# Altium schematic symbol library LimeMicroAltiumLib_schLib_r05.SchLib: 582 symbols (part 12 of 13) (continued)
## TQL9092 (continued)
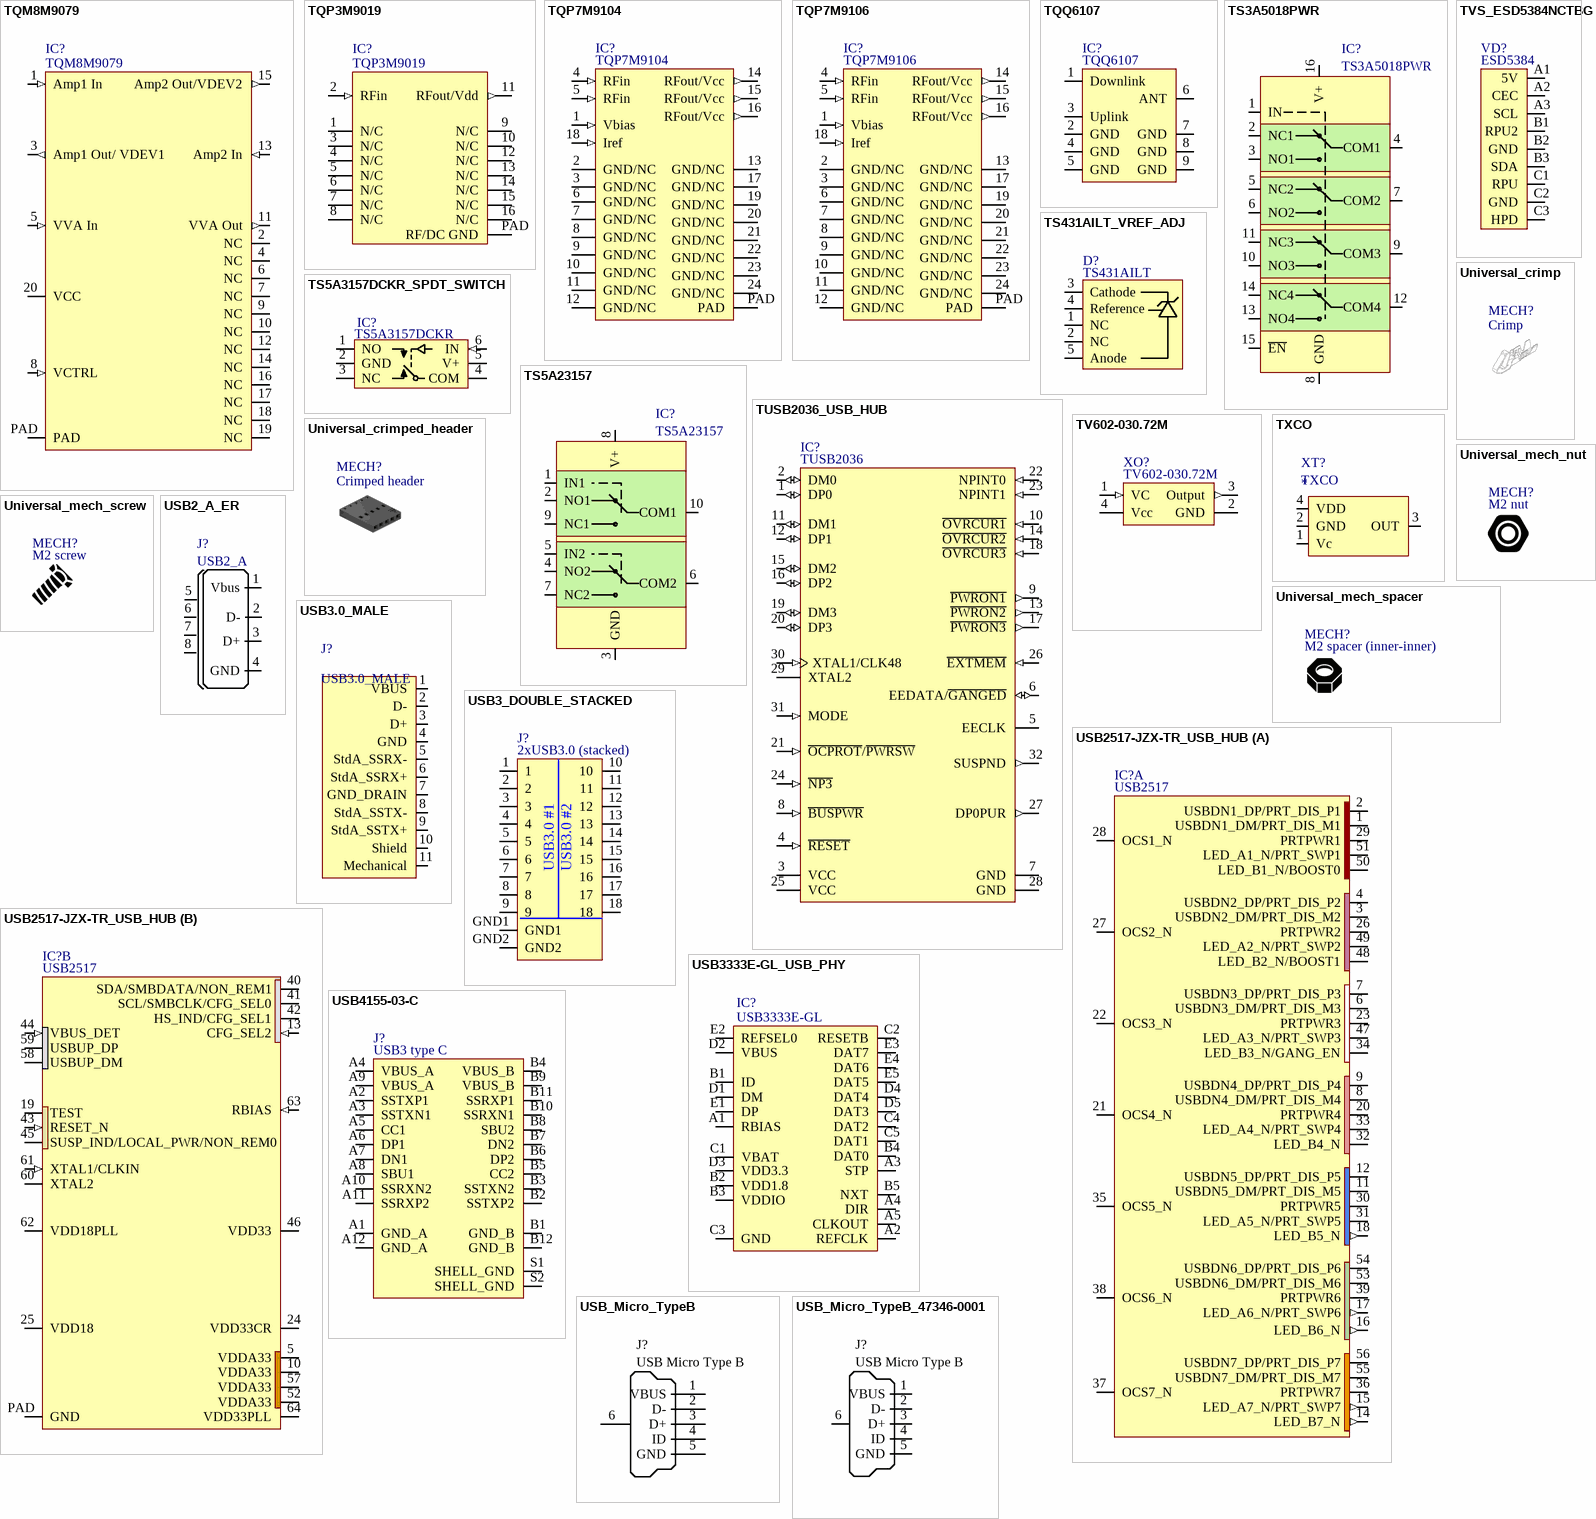
[diagram p66: symbols TQM8M9079 to USB_Micro_TypeB_47346-0001]

## TQM8M9079
designator IC?
Part Description: RF Amplifier 500-2700MHz NF 4dB Gain 38dB Attn. 30dB; Manufacturer: Qorvo; Manufacturer Part Number 1: TQM8M9079; Supplier Part Number 1: 772-TQM8M9079; Supplier 1: Mouser
footprint TQM8M9079
pins: 1 Amp1 In (in), 2 NC, 3 Amp1 Out/ VDEV1 (out), 4 NC, 5 VVA In (in), 6 NC, 7 NC, 8 VCTRL (in), 9 NC, 10 NC, 11 VVA Out (out), 12 NC, 13 Amp2 In (in), 14 NC, 15 Amp2 Out/VDEV2 (out), 16 NC, 17 NC, 18 NC, 19 NC, 20 VCC (power), PAD

## TQP3M9019
designator IC?
High Linearity LNA Gain Block (20 – 4000 MHz)
footprint TQP3M9019_QFN3X3-16 (Quad Flat No Lead, Plastic; 16 Terminals; Body 3 x 3 mm; Pitch 0.5 mm)
pins: 1 N/C, 2 RFin (in), 3 N/C, 4 N/C, 5 N/C, 6 N/C, 7 N/C, 8 N/C, 9 N/C, 10 N/C, 11 RFout/Vdd (out), 12 N/C, 13 N/C, 14 N/C, 15 N/C, 16 N/C, PAD RF/DC GND

## TQP7M9104
designator IC?
2 Watt High Linearity Amplifier (700 - 2700 MHz); Part Description: RF Amplifier 700-4000MHZ 5VOLT GAIN 15.8DB NF 4.4DB; Manufacturer: Qorvo; Manufacturer Part Number 1: TQP7M9104; Supplier Part Number 1: 772-TQP7M9104; Supplier 1: Mouser
footprint TQP7M9104_QFN24
pins: 1 Vbias (in), 2 GND/NC, 3 GND/NC, 4 RFin (in), 5 RFin (in), 6 GND/NC, 7 GND/NC, 8 GND/NC, 9 GND/NC, 10 GND/NC, 11 GND/NC, 12 GND/NC, 13 GND/NC, 14 RFout/Vcc (out), 15 RFout/Vcc (out), 16 RFout/Vcc (out), 17 GND/NC, 18 Iref (in), 19 GND/NC, 20 GND/NC, 21 GND/NC, 22 GND/NC, 23 GND/NC, 24 GND/NC, PAD

## TQP7M9106
designator IC?
2 Watt High Linearity Amplifier (50 - 1500 MHz); Part Description: RF Amplifier 50-1500MHz 2W Gain 20.8dB@940MHz; Manufacturer: Qorvo; Manufacturer Part Number 1: TQP7M9106; Supplier Part Number 1: 772-TQP7M9106; Supplier 1: Mouser
footprint TQP7M9106_QFN24 (Footprint not found)
pins: 1 Vbias (in), 2 GND/NC, 3 GND/NC, 4 RFin (in), 5 RFin (in), 6 GND/NC, 7 GND/NC, 8 GND/NC, 9 GND/NC, 10 GND/NC, 11 GND/NC, 12 GND/NC, 13 GND/NC, 14 RFout/Vcc (out), 15 RFout/Vcc (out), 16 RFout/Vcc (out), 17 GND/NC, 18 Iref (in), 19 GND/NC, 20 GND/NC, 21 GND/NC, 22 GND/NC, 23 GND/NC, 24 GND/NC, PAD

## TQQ6107
designator IC?
Part Description: Band 7 BAW Duplexer, 70 MHz Bandwidth, 2.00 x 2.50 x 1.0 mm; Manufacturer Part Number 1: TQQ6107; Supplier Part Number 1: TQQ6107; Supplier 1: Qorvo
footprint TQQ6107
pins: 1 Downlink, 2 GND, 3 Uplink, 4 GND, 5 GND, 6 ANT (io), 7 GND, 8 GND, 9 GND

## TS3A5018PWR
designator IC?
Manufacturer: TEXAS INSTRUMENTS; On State Resistance Max: 10; Analog Switch Case: TSSOP; Supply Voltage Range: 2.3V to 3.6; No. of Pins: 16; Analog Switch Type: SPDT; Supplier 1: Newark; Manufacturer Part Number: TS3A5018PW; Supplier Part Number 1: 71J8329
footprint TS3A5018PWR (TSOP, 16-Leads, Body 5,00x4,40mm, Pitch 0,65mm, IPC Medium Density)
pins: 1 IN, 2 NC1, 3 NO1, 4 COM1, 5 NC2, 6 NO2, 7 COM2, 8 GND, 9 COM3, 10 NO3, 11 NC3, 12 COM4, 13 NO4, 14 NC4, 15 ~{EN}, 16 V+

## TS5A3157DCKR_SPDT_SWITCH
designator IC?, comment TS5A3157DCKR
Manufacturer: Texas Instruments; Part Description: 1 Circuit IC Switch 2:1 10Ohm SC-70-6; Nominal Supply Current: 2.5uA; Max Supply Voltage: 5.5V; Min Supply Voltage: 1.65V; Number of Channels: 1; Number of Outputs: 2; On-State Resistance: 10R; Turn-On Delay Time: 9.5ns; Turn-Off Delay Time: 7.5ns; Max Supply Current: 5uA; Throw Configuration: SPDT; Supply Type: Single; Bandwidth: 300MHz; Polarity: Non-Inverting; High Level Output Current: 100mA; Supplier 1: Digi-Key; Manufacturer Part Number 1: TS5A3157DCKR; Stock 1: 48414; Pricing 1: 1 = 0,42000, 10 = 0,35900, 100 = 0,26820, 500 = 0,21074, 1000 = 0,16284 (USD); RoHS: Yes; Mount: Surface Mount; Case/Package: SC; Number of Pins: 6; Weight: 8.8E-05oz; Contact Plating: Gold; Min Operating Temperature: -40°C; Max Operating Temperature: 85°C; Number of Inputs: 1; Packaging: Tape and Reel; Package Quantity: 1; Operating Supply Current: 2.5uA; Number of Bits: 1; Low Level Output Current: 100mA; Length: 2mm; Height: 0.9mm; Width: 1.25mm; Radiation Hardening: No; REACH SVHC: No SVHC; Lead Free: Lead Free; ComponentLink1URL: https://datasheet.ciiva.com/2980/ts5a3157-2980096.pdf?src-supplier=Avnet; ComponentLink1Description: https://datasheet.ciiva.com/2980/ts5a3157-2980096.pdf?src-supplier=Avnet; ComponentLink2URL: https://datasheet.ciiva.com/15127/getdatasheetpartid-250849-15127576.pdf?src-supplier=Verical; ComponentLink2Description: https://datasheet.ciiva.com/15127/getdatasheetpartid-250849-15127576.pdf?src-supplier=Verical; ComponentLink3URL: https://datasheet.ciiva.com/30509/ts5a3157dckr-30509768.pdf?src-supplier=RSComponents; ComponentLink3Description: https://datasheet.ciiva.com/30509/ts5a3157dckr-30509768.pdf?src-supplier=RSComponents; ComponentLink4URL: https://datasheet.ciiva.com/22652/1716489-22652683.pdf?src-supplier=Element14; ComponentLink4Description: https://datasheet.ciiva.com/22652/1716489-22652683.pdf?src-supplier=Element14; ComponentLink5URL: https://datasheet.ciiva.com/26266/ts5a3157-26266631.pdf?src-supplier=Avnet+Europe; ComponentLink5Description: https://datasheet.ciiva.com/26266/ts5a3157-26266631.pdf?src-supplier=Avnet+Europe; ComponentLink6URL: https://datasheet.ciiva.com/46382/1877040-46382312.pdf?src-supplier=Element14; ComponentLink6Description: https://datasheet.ciiva.com/46382/1877040-46382312.pdf?src-supplier=Element14; ComponentLink7URL: https://datasheet.ciiva.com/1680/ts5a3157-1680281.pdf?src-supplier=Digi-Key; ComponentLink7Description: https://datasheet.ciiva.com/1680/ts5a3157-1680281.pdf?src-supplier=Digi-Key; ComponentLink8URL: https://datasheet.ciiva.com/2978/ts5a3157-2978985.pdf?src-supplier=Avnet; ComponentLink8Description: https://datasheet.ciiva.com/2978/ts5a3157-2978985.pdf?src-supplier=Avnet; ComponentLink9URL: https://datasheet.ciiva.com/1680/ts5a3157-1680250.pdf?src-supplier=Digi-Key; ComponentLink9Description: https://datasheet.ciiva.com/1680/ts5a3157-1680250.pdf?src-supplier=Digi-Key; ComponentLink10URL: https://datasheet.ciiva.com/1680/ts5a3157-1680282.pdf?src-supplier=Digi-Key; ComponentLink10Description: https://datasheet.ciiva.com/1680/ts5a3157-1680282.pdf?src-supplier=Digi-Key; ComponentLink11URL: https://datasheet.ciiva.com/28500/ts5a3157-28500239.pdf?src-supplier=Element14; ComponentLink11Description: https://datasheet.ciiva.com/28500/ts5a3157-28500239.pdf?src-supplier=Element14; ComponentLink12URL: https://datasheet.ciiva.com/41461/001187245-da-01-en-ic-switch-spdt-ts5a3157dckr-sc-70-6-tid-41461835.pdf?src-supplier=Conrad; ComponentLink12Description: https://datasheet.ciiva.com/41461/001187245-da-01-en-ic-switch-spdt-ts5a3157dckr-sc-70-6-tid-41461835.pdf?src-supplier=Conrad; Supplier Part Number 1: 296-17588-1-ND
footprint SC-70-6_TS5A3157DCKR (SC-70 (SOT323), 6 pin)
pins: 1 NO (io), 2 GND, 3 NC (io), 4 COM (io), 5 V+ (power), 6 IN (in)

## TS5A23157
designator IC?
TS3A5018; Manufacturer: Texas Instruments; Current - Supply: 1µA; Circuit: 2 x SPDT; On-State Resistance: 10 Ohm; Voltage Supply Source: Single Supply; Voltage - Supply, Single/Dual (±): 1.8 V ~ 5.5 V; Function: Switch; Supplier 1: Digi-Key; Category: Integrated Circuits (ICs); Supplier Device Package: 10-VSSOP; Package / Case: 10-TFSOP, 10-MSOP (0.118", 3.00mm Width); Mounting Type: Surface Mount; Supplier Part Number 1: 296-17076-1-ND
footprint TS5A23157 (TSSOP, 10-Leads, Body 3,00x3,00mm, Pitch 0,50mm, IPC Medium Density)
pins: 1 IN1, 2 NO1, 3 GND, 4 NO2, 5 IN2, 6 COM2, 7 NC2, 8 V+, 9 NC1, 10 COM1

## TS431AILT_VREF_ADJ
designator D?, comment TS431AILT
Manufacturer: STMicroelectronics; Part Description: Shunt Voltage Reference IC 6V ±1% 30mA SOT-23-5; Nominal Supply Current: 30mA; Output Voltage: 6V; Max Input Voltage: 10V; Number of Channels: 1; Tolerance: 1%; Temperature Coefficient: 100ppm/°C; Cathode Current: 60uA; Reference Voltage: 1.24V; Min Output Voltage: 1.228V; Reference Type: Adjustable,Shunt; Supplier 1: Digi-Key; Manufacturer Part Number 1: TS431AILT; Stock 1: 5120; Pricing 1: 1=0.62, 10=0.533, 100=0.398, 500=0.3127, 1000=0.24164 (USD); Mount: Surface Mount; Case/Package: SOT-23-5; Number of Pins: 5; Min Operating Temperature: -40°C; Max Operating Temperature: 125°C; Packaging: Tape and Reel; Max Output Current: 30mA; Package Quantity: 1; Output Current: 30mA; Max Output Voltage: 6V; Termination: SMD/SMT; Length: 3mm; Height: 1.3mm; Width: 1.75mm; Radiation Hardening: No; REACH SVHC: No SVHC; Lead Free: Lead Free; ComponentLink1URL: https://www.verical.com/server-webapp/html/getDatasheet?partID=139054; ComponentLink1Description: https://www.verical.com/server-webapp/html/getDatasheet?partID=139054; ComponentLink2URL: http://www.st.com/content/ccc/resource/technical/document/datasheet/group1/3f/2e/70/d8/11/ee/47/a9/CD00001336/files/CD00001336.pdf/jcr:content/translations/en.CD00001336.pdf; ComponentLink2Description: http://www.st.com/content/ccc/resource/technical/document/datasheet/group1/3f/2e/70/d8/11/ee/47/a9/CD00001336/files/CD00001336.pdf/jcr:content/translations/en.CD00001336.pdf; ComponentLink3URL: http://www.st.com/web/en/resource/technical/document/datasheet/CD00001336.pdf; ComponentLink3Description: http://www.st.com/web/en/resource/technical/document/datasheet/CD00001336.pdf; ComponentLink4URL: http://www.farnell.com/datasheets/1700526.pdf; ComponentLink4Description: http://www.farnell.com/datasheets/1700526.pdf; ComponentLink5URL: http://www.mouser.com/ds/2/389/ts431-957324.pdf; ComponentLink5Description: http://www.mouser.com/ds/2/389/ts431-957324.pdf; ComponentLink6URL: http://www.produktinfo.conrad.com/datenblaetter/1100000-1199999/001185084-da-01-en-IC_VREF_SHUNT_PRE_TS431AILT_SOT_23_5_STM.pdf; ComponentLink6Description: http://www.produktinfo.conrad.com/datenblaetter/1100000-1199999/001185084-da-01-en-IC_VREF_SHUNT_PRE_TS431AILT_SOT_23_5_STM.pdf; ComponentLink7URL: http://datasheet.iiic.cc/stmicroelectronics/TS431AILT.pdf; ComponentLink7Description: http://datasheet.iiic.cc/stmicroelectronics/TS431AILT.pdf; Supplier Part Number 1: 497-2279-6-ND
footprint SOT23-5
pins: 1 NC, 2 NC, 3 Cathode, 4 Reference, 5 Anode

## TUSB2036_USB_HUB
designator IC?, comment TUSB2036
Part Description: USB Hub Controller USB 2.0 USB Interface 32-LQFP (7x7); Manufacturer: Texas Instruments; Manufacturer Part Number 1: TUSB2036VF; Operating Supply Voltage: 3.3V; Operating Supply Current: 40mA; Data Rate: 12Mbps; Min Supply Voltage: 3V; Max Supply Voltage: 3.6V; Number of Ports: 3; USB Standard: USB 2.0; ComponentLink1URL: https://datasheet.ciiva.com/1505/1535702-1505189.pdf?src-supplier=Element14; ComponentLink1Description: https://datasheet.ciiva.com/1505/1535702-1505189.pdf?src-supplier=Element14; ComponentLink2URL: https://datasheet.ciiva.com/1613/tusb2036-1613315.pdf?src-supplier=Newark; ComponentLink2Description: https://datasheet.ciiva.com/1613/tusb2036-1613315.pdf?src-supplier=Newark; ComponentLink3URL: https://datasheet.ciiva.com/15134/getdatasheetpartid-225880-15134503.pdf?src-supplier=Verical; ComponentLink3Description: https://datasheet.ciiva.com/15134/getdatasheetpartid-225880-15134503.pdf?src-supplier=Verical; ComponentLink4URL: https://datasheet.ciiva.com/5835/1535702-5835498.pdf?src-supplier=Farnell; ComponentLink4Description: https://datasheet.ciiva.com/5835/1535702-5835498.pdf?src-supplier=Farnell; ComponentLink5URL: https://datasheet.ciiva.com/1695/tusb2036-1695700.pdf?src-supplier=Digi-Key; ComponentLink5Description: https://datasheet.ciiva.com/1695/tusb2036-1695700.pdf?src-supplier=Digi-Key; ComponentLink6URL: https://datasheet.ciiva.com/41461/001187495-da-01-en-ic-2-3-port-usb-h-tusb2036vf-lqfp-32-tid-41461301.pdf?src-supplier=Conrad; ComponentLink6Description: https://datasheet.ciiva.com/41461/001187495-da-01-en-ic-2-3-port-usb-h-tusb2036vf-lqfp-32-tid-41461301.pdf?src-supplier=Conrad; Supplier 1: Digi-Key; Supplier Part Number 1: 296-11086-ND; Stock 1: 77; Pricing 1: 1=4,18000, 10=3,75400, 25=3,54880, 80=3,07575, 250=2,91796, 500=2,61828, 1000=2,38080 (USD); RoHS: Yes; Case/Package: LQFP; Number of Pins: 32; Weight: 0.006148oz; Min Operating Temperature: 0°C; Max Operating Temperature: 70°C; Package Quantity: 250; Packaging: Tray; Termination: SMD/SMT; Length: 7mm; Width: 7mm; Height: 1.4mm; Radiation Hardening: No; Lead Free: Lead Free; RoHS Compliant: Yes; REACH SVHC: No SVHC
footprint TUSB2036_USB_HUB_32-LQFP (Footprint not found)
pins: 1 DP0 (io) "Root port USB differential data plus. DP0 paired with DM0 constitutes the upstream USB port.", 2 DM0 (io) "Root port USB differential data minus. DM0 paired with DP0 constitutes the upstream USB port.", 3 VCC (power) "3.3-V supply voltage", 4 ~{RESET} (in) "R\E\S\E\T\ is an active low TTL input with hysteresis and must be asserted at power up. When R\E\S\E\T\ is asserted, all logic is initialized. Generally, a reset with a pulse width between 100 us and 1 ms is recommended (See Datasheet)", 5 EECLK (hiz) "EEPROM serial clock. When EXTMEM is high, the EEPROM interface is disabled. The EECLK terminal is disabled and must be left floating (unconnected). When EXTMEM is low, EECLK acts as a 3-state serial clock output to the (See Datasheet)", 6 EEDATA/~{GANGED} (io) "EEPROM serial data/power-management mode indicator. When E\X\T\M\E\M\ is high, EEDATA/G\A\N\G\E\D\ selects between ganged or per-port power overcurrent detection for the downstream ports. When E\X\T\M\E\M\ is (See Datasheet)", 7 GND (power) "GND terminals must be tied to ground for proper operation", 8 ~{BUSPWR} (in) "Power source indicator. B\U\S\P\W\R\ is an active-low input that indicates whether the downstream ports source their power from the USB cable or a local power supply. For the bus-power mode, this terminal must be pulled low, (See Datasheet)", 9 ~{PWRON1} (out) "Power-on/-off control signals. P\W\R\O\N\1\-P\W\R\O\N\3\ are active low, push-pull outputs that enables the external power switch device. Push-pull outputs eliminate the pullup resistors which open-drain outputs require. (See Datasheet)", 10 ~{OVRCUR1} (in) "Overcurrent input. O\V\R\C\U\R\1\ - O\V\R\C\U\R\3\ are active low. For per-port overcurrent detection, one overcurrent input is available for each of the three downstream ports. In the ganged mode, any O\V\R\C\U\R\ input may (See Datasheet)", 11 DM1 (io) "USB differential data minus. DM1-DM3 paired with DP1-DP3 support up to four downstream USB ports.", 12 DP1 (io) "USB differential data plus. DP1-DP3 paired with DM1-DM3 support up to four downstream USB ports.", 13 ~{PWRON2} (out) "Power-on/-off control signals. P\W\R\O\N\1\-P\W\R\O\N\3\ are active low, push-pull outputs that enables the external power switch device. Push-pull outputs eliminate the pullup resistors which open-drain outputs require. (See Datasheet)", 14 ~{OVRCUR2} (in) "Overcurrent input. O\V\R\C\U\R\1\ - O\V\R\C\U\R\3\ are active low. For per-port overcurrent detection, one overcurrent input is available for each of the three downstream ports. In the ganged mode, any O\V\R\C\U\R\ input may (See Datasheet)", 15 DM2 (io) "USB differential data minus. DM1-DM3 paired with DP1-DP3 support up to four downstream USB ports.", 16 DP2 (io) "USB differential data plus. DP1-DP3 paired with DM1-DM3 support up to four downstream USB ports.", 17 ~{PWRON3} (out) "Power-on/-off control signals. P\W\R\O\N\1\-P\W\R\O\N\3\ are active low, push-pull outputs that enables the external power switch device. Push-pull outputs eliminate the pullup resistors which open-drain outputs require. (See Datasheet)", 18 ~{OVRCUR3} (in) "Overcurrent input. O\V\R\C\U\R\1\ - O\V\R\C\U\R\3\ are active low. For per-port overcurrent detection, one overcurrent input is available for each of the three downstream ports. In the ganged mode, any O\V\R\C\U\R\ input may (See Datasheet)", 19 DM3 (io) "USB differential data minus. DM1-DM3 paired with DP1-DP3 support up to four downstream USB ports.", 20 DP3 (io) "USB differential data plus. DP1-DP3 paired with DM1-DM3 support up to four downstream USB ports.", 21 ~{OCPROT}/~{PWRSW} (in) "Overcurrent Protection for bus-powered hub (active low). /Power Switching for self-powered hub (active low). The terminal has a different meaning for the bus or self-powered hub. If the terminal is logic high the internal (See Datasheet)", 22 NPINT0 (in) "Number of ports internal to hub system, which are permanently attached (see Table 1).", 23 NPINT1 (in) "Number of ports internal to hub system, which are permanently attached (see Table 1).", 24 ~{NP3} (in) "Number of ports is 3. Active low input. A logic 0 configures the system to use 3 ports. A logic 1 configures the system to use 2 ports.", 25 VCC (power) "3.3-V supply voltage", 26 ~{EXTMEM} (in) "When E\X\T\M\E\M\ is high, the serial EEPROM interface of the device is disabled. When E\X\T\M\E\M\ is low, terminals 5 and 6 are configured as the clock and data terminals of the serial EEPROM interface, respectively.", 27 DP0PUR (out) "Pullup resistor connection. When a system reset happens (R\E\S\E\T\ being driven to low, but not USB reset) or any logic level change on B\U\S\P\W\R\ terminal, DP0PUR output is inactive (floating) until the internal counter (See Datasheet)", 28 GND (power) "GND terminals must be tied to ground for proper operation.", 29 XTAL2 "Crystal 2. XTAL2 is a 6-MHz crystal output. This terminal must be left open when using an oscillator", 30 XTAL1/CLK48 (in) "Crystal 1/48-MHz clock input. When MODE is low, XTAL1/CLK48 is a 6-MHz crystal input with 50% duty cycle. An internal APLL generates the 48-MHz and 12-MHz clocks used internally by the ASIC logic. When MODE is (See Datasheet)", 31 MODE (in) "Mode select. When MODE is low, the APLL output clock is selected as the clock source to drive the internal core of the device and 6-MHz crystal or oscillator can be used. When MODE is high, the clock on XTAL1/CLK48 is (See Datasheet)", 32 SUSPND (out) "Suspend status. SUSPND is an active high output available for external logic power-down operations. During the suspend mode, SUSPND is high. SUSPND is low for normal operation."

## TV602-030.72M
designator XO?
Part Description: TV602-030.72M voltage controlled oscillator, 5x7mm, high stability and low phase noise; Manufacturer: Connor Winfield; Supplier Part Number 1: TV602-030.72M; Manufacturer Part Number 1: TV602-030.72M; Supplier 1: Connor Winfield
footprint TV602-030.72M (TV602-030.72M Connor Winfield)
pins: 1 VC (in), 2 GND, 3 Output (out), 4 Vcc (power)

## TVS_ESD5384NCTBG
designator VD?, comment ESD5384
Manufacturer: ON Semiconductor; Manufacturer Part Number 1: ESD5384NCTBG; Part Description: TVS DIODE 3V 9WLCSP; Capacitance: 29pF; Direction: Unidirectional; Number of Unidirectional Channels: 5; Reverse Standoff Voltage: 3V; Min Breakdown Voltage: 6V; Power Line Protection: No; ESD Protection: Yes; Max Reverse Leakage Current: 200nA; Supplier 1: Digi-Key; Stock 1: 4993; Pricing 1: 1=0.47, 10=0.406, 100=0.3028, 500=0.23794, 1000=0.18386 (USD); Number of Pins: 9; Min Operating Temperature: -30°C; Max Operating Temperature: 85°C; Package Quantity: 5000; Packaging: Tape and Reel; Number of Lines: 5; Composition: Zener; Length: 1.14mm; Height: 0.63mm; Width: 1.14mm; Depth: 1.14mm; Radiation Hardening: No; Lead Free: Lead Free; Halogen Free: Halogen Free; Supplier Part Number 1: ESD5384NCTBGOSDKR-ND
footprint TVS_ ESD5384NCTBG
pins: A1 5V, A2 CEC, A3 SCL, B1 RPU2, B2 GND, B3 SDA, C1 RPU, C2 GND, C3 HPD

## TXCO
designator XT?
Assembly Info: *
pins: 1 Vc, 2 GND, 3 OUT, 4 VDD

## Universal_crimp
designator MECH?, comment Crimp  (mechanical)
Part Description: *

## Universal_crimped_header
designator MECH?, comment Crimped header  (mechanical)
Part Description: *

## Universal_mech_nut
designator MECH?, comment M2 nut  (mechanical)
Part Description: *

## Universal_mech_screw
designator MECH?, comment M2 screw  (mechanical)
Part Description: *

## Universal_mech_spacer
designator MECH?, comment M2 spacer (inner-inner)  (mechanical)
Part Description: *

## USB2_A_ER
designator J?, comment USB2_A
Manufacturer Part Number: A-USB/2-A-E-R; Connector Type: USB - A; Specifications: USB 2.0; Number of Contacts: 4; Supplier 1: Digi-Key; Category: Connectors, Interconnects; Supplier Part Number 1: AE10400-ND
footprint USB2_A
pins: 1 Vbus, 2 D-, 3 D+, 4 GND, 5 Shell, 6 Shell, 7 Shell, 8 Shell

## USB3.0_MALE
designator J?
Manufacturer Part Number 1: 692112030100; Manufacturer: Wurth Electronics Inc; Part Description: USB - A USB 3.0, Super Speed Plug Connector 9 Position Surface Mount, Right Angle, Horizontal; Specifications: USB 3.0, Super Speed; Number of Contacts: 9; Connector Type: USB - A; Gender: Plug; Packaging: Tray; Features: Board Lock, Shielded; Ingress Protection: -; Category: Connectors, Interconnects; RoHS: RoHS Compliant; Mounting Type: Surface Mount, Right Angle, Horizontal; Supplier 1: Digi-Key; Supplier Part Number 1: 732-3157-ND
footprint USB3A_SM
pins: 1 VBUS, 2   D-, 3 D+, 4 GND, 5 StdA_SSRX-, 6 StdA_SSRX+, 7 GND_DRAIN, 8 StdA_SSTX-, 9 StdA_SSTX+, 10 Shield, 11 Mechanical

## USB3_DOUBLE_STACKED
designator J?, comment 2xUSB3.0 (stacked)
Part Description: 2xUSB3.0, vertical, stacked
footprint USB3_DOUBLE_STACKED
pins: 1, 2, 3, 4, 5, 6, 7, 8, 9, 10, 11, 12, 13, 14, 15, 16, 17, 18, GND1, GND2
text: USB3.0 #1; USB3.0 #2

## USB2517-JZX-TR_USB_HUB
designator IC?, comment USB2517
Part Description: USB Hub Controller USB 2.0 USB Interface 64-QFN (9x9); Manufacturer: Microchip; Manufacturer Part Number 1: USB2517-JZX-TR; Interface: USB; Operating Supply Current: 130mA; Supplier 1: Digi-Key; Supplier Part Number 1: USB2517-JZX-CT-ND; Stock 1: 26622; Pricing 1: 1=5,72000, 25=5,55000 (USD); RoHS: Yes; Min Operating Temperature: 0°C; Max Operating Temperature: 70°C; Package Quantity: 3000; Packaging: Tape and Reel; Lead Free: Lead Free; RoHS Compliant: Yes; ComponentLink1URL: https://datasheet.ciiva.com/29644/2517-29644802.pdf?src-supplier=Digi-Key; ComponentLink1Description: https://datasheet.ciiva.com/29644/2517-29644802.pdf?src-supplier=Digi-Key
footprint USB2517-JZX-TR_USB_HUB_QFN64
part A pins: 1 USBDN1_DM/PRT_DIS_M1 (io), 2 USBDN1_DP/PRT_DIS_P1 (io), 3 USBDN2_DM/PRT_DIS_M2 (io), 4 USBDN2_DP/PRT_DIS_P2 (io), 6 USBDN3_DM/PRT_DIS_M3 (io), 7 USBDN3_DP/PRT_DIS_P3 (io), 8 USBDN4_DM/PRT_DIS_M4 (io), 9 USBDN4_DP/PRT_DIS_P4 (io), 11 USBDN5_DM/PRT_DIS_M5 (io), 12 USBDN5_DP/PRT_DIS_P5 (io), 14 LED_B7_N (out), 15 LED_A7_N/PRT_SWP7 (out), 16 LED_B6_N (out), 17 LED_A6_N/PRT_SWP6 (out), 18 LED_B5_N (out), 20 PRTPWR4, 21 OCS4_N, 22 OCS3_N, 23 PRTPWR3, 26 PRTPWR2, 27 OCS2_N, 28 OCS1_N, 29 PRTPWR1, 30 PRTPWR5, 31 LED_A5_N/PRT_SWP5, 32 LED_B4_N, 33 LED_A4_N/PRT_SWP4, 34 LED_B3_N/GANG_EN, 35 OCS5_N, 36 PRTPWR7, 37 OCS7_N, 38 OCS6_N, 39 PRTPWR6, 47 LED_A3_N/PRT_SWP3, 48 LED_B2_N/BOOST1, 49 LED_A2_N/PRT_SWP2, 50 LED_B1_N/BOOST0, 51 LED_A1_N/PRT_SWP1, 53 USBDN6_DM/PRT_DIS_M6 (io), 54 USBDN6_DP/PRT_DIS_P6 (io), 55 USBDN7_DM/PRT_DIS_M7 (io), 56 USBDN7_DP/PRT_DIS_P7 (io)
part B pins: 5 VDDA33 (power), 10 VDDA33 (power), 13 CFG_SEL2 (in), 19 TEST, 24 VDD33CR (power), 25 VDD18 (power), 40 SDA/SMBDATA/NON_REM1 (io), 41 SCL/SMBCLK/CFG_SEL0 (io), 42 HS_IND/CFG_SEL1 (io), 43 RESET_N (in), 44 VBUS_DET (in), 45 SUSP_IND/LOCAL_PWR/NON_REM0 (io), 46 VDD33 (power), 52 VDDA33 (power), 57 VDDA33 (power), 58 USBUP_DM (io), 59 USBUP_DP (io), 60 XTAL2 (io), 61 XTAL1/CLKIN (in), 62 VDD18PLL (power), 63 RBIAS (in), 64 VDD33PLL (power), PAD GND (power)